# Altium footprint library chipfc_extras_footprint.PCBLIB: 89 footprints (part 4 of 6)
Each footprint in its own frame and in the unit in brackets; x right, y up, seen from the top. Pads: shape width x height; smd on the part's side, far side on the other; paste and mask are expansions set on the pad; w line width, h text height; cw(c..) or ccw(c..) is an arc to the next point about the centre after c.
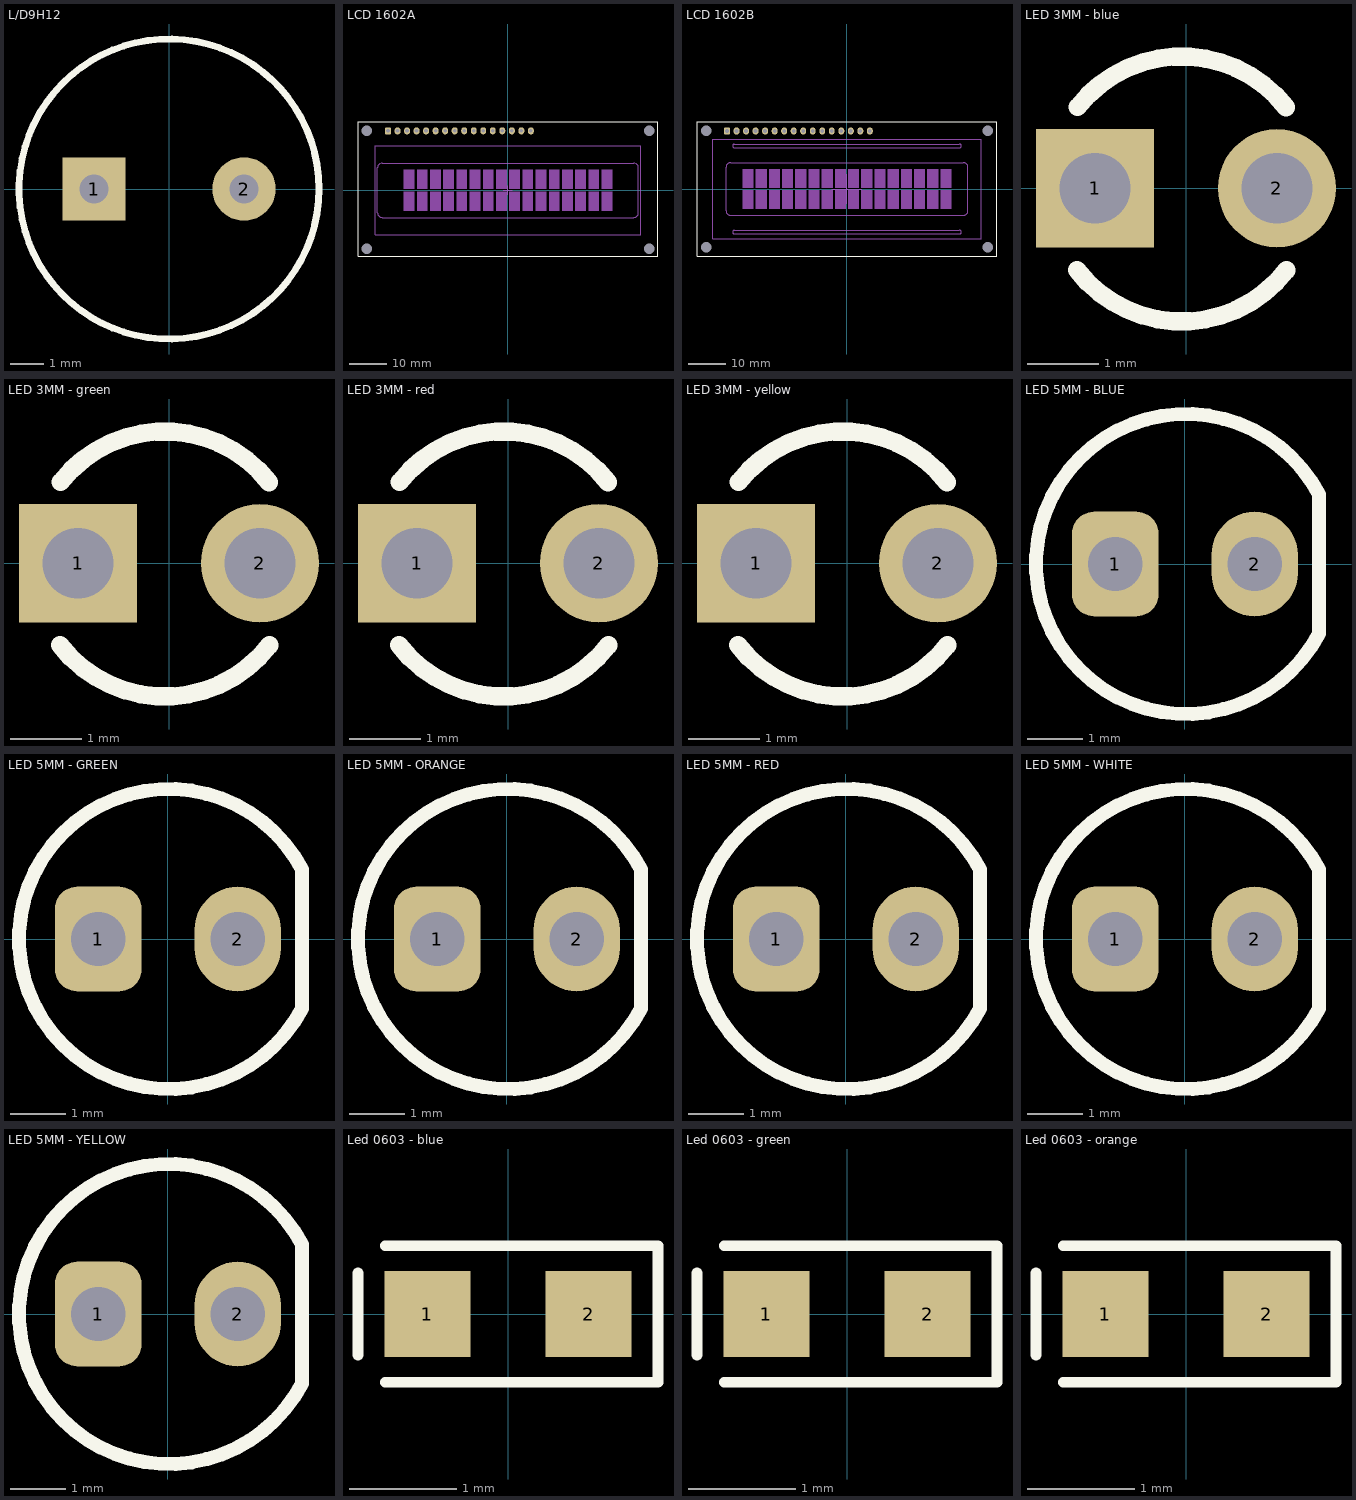
[diagram p3: the footprints below, top view; thin cyan lines are the x and y axes]

## L/D9H12 [mm] "inductor"
pads (2):
  rect 1.905x1.905 hole 0.864: 1(-2.25,0)
  round 1.905 hole 0.864: 2(2.25,0)
Top Overlay:
  circle w0.203: c0,0 r4.5
3D body "User Library-Inductor 10x12 (200 mils).STEP": height 12.13, standoff -3.87, extent -5,-5.115 5,4.885

## LCD 1602A [mm]
pads (20):
  rrect50% 1.575x1.905 hole 0.991: 1(-32,15.85)
  oval 1.575x1.905 hole 0.991: 2(-29.46,15.85) 3(-26.92,15.85) 4(-24.38,15.85) 5(-21.84,15.85) 6(-19.3,15.85) 7(-16.76,15.85) 8(-14.22,15.85) 9(-11.68,15.85) 10(-9.14,15.85) 11(-6.6,15.85) 12(-4.06,15.85) 13(-1.52,15.85) 14(1.02,15.85) 15(3.56,15.85) 16(6.1,15.85)
  round 0 hole 2.8: HOLE(-37.7,15.85) HOLF(37.7,15.85) HOLG(37.7,-15.55) HOLH(-37.7,-15.55)
Top Overlay:
  lines w0.254: -40,-17.65 -40,18.35 40,18.35 40,-17.65 -40,-17.65
Mechanical 13:
  rectangle: 24.95,0.35 27.85,5.5
  rectangle: 24.95,-5.5 27.85,-0.35
  rectangle: 21.43,0.35 24.33,5.5
  rectangle: 21.43,-5.5 24.33,-0.35
  rectangle: 17.91,0.35 20.81,5.5
  rectangle: 17.91,-5.5 20.81,-0.35
  rectangle: 14.39,0.35 17.29,5.5
  rectangle: 14.39,-5.5 17.29,-0.35
  rectangle: 10.87,0.35 13.77,5.5
  rectangle: 10.87,-5.5 13.77,-0.35
  rectangle: 7.35,0.35 10.25,5.5
  rectangle: 7.35,-5.5 10.25,-0.35
  rectangle: 3.83,0.35 6.73,5.5
  rectangle: 3.83,-5.5 6.73,-0.35
  rectangle: 0.31,0.35 3.21,5.5
  rectangle: 0.31,-5.5 3.21,-0.35
  rectangle: -3.21,0.35 -0.31,5.5
  rectangle: -3.21,-5.5 -0.31,-0.35
  rectangle: -6.73,0.35 -3.83,5.5
  rectangle: -6.73,-5.5 -3.83,-0.35
  rectangle: -10.25,0.35 -7.35,5.5
  rectangle: -10.25,-5.5 -7.35,-0.35
  rectangle: -13.77,0.35 -10.87,5.5
  rectangle: -13.77,-5.5 -10.87,-0.35
  rectangle: -17.29,0.35 -14.39,5.5
  rectangle: -17.29,-5.5 -14.39,-0.35
  rectangle: -20.81,0.35 -17.91,5.5
  rectangle: -20.81,-5.5 -17.91,-0.35
  rectangle: -24.33,0.35 -21.43,5.5
  rectangle: -24.33,-5.5 -21.43,-0.35
  rectangle: -27.85,-5.5 -24.95,-0.35
  rectangle: -27.85,0.35 -24.95,5.5
  lines w0.203: -1.2,0 1.2,0 ; 0,-1.2 0,1.2 ; -35.4,-11.9 35.4,-11.9 35.4,11.9 -35.4,11.9 -35.4,-11.9 ; -34.8,-5.95 ccw(c-33.5,-5.95) -33.5,-7.25 33.5,-7.25 ccw(c33.5,-5.95) 34.8,-5.95 34.8,5.95 ccw(c33.5,5.95) 33.5,7.25 -33.5,7.25 ccw(c-33.5,5.95) -34.8,5.95 -34.8,-5.95
3D body "User Library-AC162B.step": height 11, standoff -2.9, extent -40,-17.65 40,18.35

## LCD 1602B [mm]
pads (20):
  rrect50% 1.575x1.905 hole 0.991: 1(-32,15.46)
  oval 1.575x1.905 hole 0.991: 2(-29.46,15.46) 3(-26.92,15.46) 4(-24.38,15.46) 5(-21.84,15.46) 6(-19.3,15.46) 7(-16.76,15.46) 8(-14.22,15.46) 9(-11.68,15.46) 10(-9.14,15.46) 11(-6.6,15.46) 12(-4.06,15.46) 13(-1.52,15.46) 14(1.02,15.46) 15(3.56,15.46) 16(6.1,15.46)
  round 0 hole 2.8: HOLE(-37.55,15.5) HOLF(37.55,15.5) HOLG(37.55,-15.5) HOLH(-37.55,-15.5)
Top Overlay:
  lines w0.254: -40,-18 40,-18 40,18 -40,18 -40,-18
Mechanical 1:
  lines w0.203: -4,0 4,0 ; 0,-4 0,4
Mechanical 13:
  rectangle: -27.9,0.3 -24.9,5.32
  rectangle: -27.9,-5.32 -24.9,-0.3
  rectangle: -24.38,-5.32 -21.38,-0.3
  rectangle: -24.38,0.3 -21.38,5.32
  rectangle: -20.86,-5.32 -17.86,-0.3
  rectangle: -20.86,0.3 -17.86,5.32
  rectangle: -17.34,-5.32 -14.34,-0.3
  rectangle: -17.34,0.3 -14.34,5.32
  rectangle: -13.82,-5.32 -10.82,-0.3
  rectangle: -13.82,0.3 -10.82,5.32
  rectangle: -10.3,-5.32 -7.3,-0.3
  rectangle: -10.3,0.3 -7.3,5.32
  rectangle: -6.78,-5.32 -3.78,-0.3
  rectangle: -6.78,0.3 -3.78,5.32
  rectangle: -3.26,-5.32 -0.26,-0.3
  rectangle: -3.26,0.3 -0.26,5.32
  rectangle: 0.26,-5.32 3.26,-0.3
  rectangle: 0.26,0.3 3.26,5.32
  rectangle: 3.78,-5.32 6.78,-0.3
  rectangle: 3.78,0.3 6.78,5.32
  rectangle: 7.3,-5.32 10.3,-0.3
  rectangle: 7.3,0.3 10.3,5.32
  rectangle: 10.82,-5.32 13.82,-0.3
  rectangle: 10.82,0.3 13.82,5.32
  rectangle: 14.34,-5.32 17.34,-0.3
  rectangle: 14.34,0.3 17.34,5.32
  rectangle: 17.86,-5.32 20.86,-0.3
  rectangle: 17.86,0.3 20.86,5.32
  rectangle: 21.38,-5.32 24.38,-0.3
  rectangle: 21.38,0.3 24.38,5.32
  rectangle: 24.9,-5.32 27.9,-0.3
  rectangle: 24.9,0.3 27.9,5.32
  lines w0.203: -35.75,-13.25 35.75,-13.25 35.75,13.25 -35.75,13.25 -35.75,-13.25 ; -32.25,-5.75 ccw(c-31,-5.75) -31,-7 31,-7 ccw(c31,-5.75) 32.25,-5.75 32.25,5.75 ccw(c31,5.75) 31,7 -31,7 ccw(c-31,5.75) -32.25,5.75 -32.25,-5.75 ; -30,-12 cw(c-30,-11.5) -30,-11 30,-11 cw(c30,-11.5) 30,-12 -30,-12 ; -30,11 cw(c-30,11.5) -30,12 30,12 cw(c30,11.5) 30,11 -30,11
3D body "User Library-AC162B.step": height 11, standoff -2.9, extent -40,-18 40,18

## LED 3MM - blue [mil]
pads (2):
  rect 65x65 hole 39: 1(-50,0)
  round 65 hole 39: 2(50,0)
Top Overlay:
  lines w10: -60.03,-45.02 ccw(c-2.37,-0.43) 55.19,-45.15 ; -59.61,44.69 cw(c-2.37,-0.43) 55,44.52
3D body "User Library-LED_d3-BLU.STEP": height 195.87, standoff -98.43, extent -65.51,-65.07 61.01,64.74

## LED 3MM - green [mil]
pads (2):
  rect 65x65 hole 39: 1(-50,0)
  round 65 hole 39: 2(50,0)
Top Overlay:
  lines w10: -60.03,-45.02 ccw(c-2.37,-0.43) 55.19,-45.15 ; -59.61,44.69 cw(c-2.37,-0.43) 55,44.52
3D body "User Library-LED D3mm GREEN.STEP": height 207.04, standoff -107.93, extent -65.51,-64.9 64.41,64.57

## LED 3MM - red [mil]
pads (2):
  rect 65x65 hole 39: 1(-50,0)
  round 65 hole 39: 2(50,0)
Top Overlay:
  lines w10: -60.03,-45.02 ccw(c-2.37,-0.43) 55.19,-45.15 ; -59.61,44.69 cw(c-2.37,-0.43) 55,44.52
3D body "User Library-LED D3mm RED.STEP": height 207.04, standoff -107.93, extent -65.51,-64.9 64.41,64.57

## LED 3MM - yellow [mil]
pads (2):
  rect 65x65 hole 39: 1(-50,0)
  round 65 hole 39: 2(50,0)
Top Overlay:
  lines w10: -60.03,-45.02 ccw(c-2.37,-0.43) 55.19,-45.15 ; -59.61,44.69 cw(c-2.37,-0.43) 55,44.52
3D body "SW3dPS-LEDd3Y.STEP": height 207.04, standoff -107.93, extent -65.51,-64.9 64.42,64.57

## LED 5MM - BLUE [mil]
pads (2):
  rrect50% 62x75 hole 39: 1(-50,0)
  oval 62x75 hole 39: 2(50,0)
Top Overlay:
  lines w10: 96.08,-49.99 cw(c0.76,0.01) 96.08,50.01 96.08,-49.99
3D body "User Library-LED 5mm Blue.STEP": height 339.75, standoff -242.93, extent -117.31,-118.49 96.08,118.5

## LED 5MM - GREEN [mil]
pads (2):
  rrect50% 62x75 hole 39: 1(-50,0)
  oval 62x75 hole 39: 2(50,0)
Top Overlay:
  lines w10: 96.08,-49.99 cw(c0.76,0.01) 96.08,50.01 96.08,-49.99
3D body "User Library-LED 5mm Green.STEP": height 339.75, standoff -242.93, extent -117.31,-118.49 96.08,118.5

## LED 5MM - ORANGE [mil]
pads (2):
  rrect50% 62x75 hole 39: 1(-50,0)
  oval 62x75 hole 39: 2(50,0)
Top Overlay:
  lines w10: 96.08,-49.99 cw(c0.76,0.01) 96.08,50.01 96.08,-49.99
3D body "User Library-LED 5mm Orange.STEP": height 339.75, standoff -242.93, extent -117.31,-118.49 96.08,118.5

## LED 5MM - RED [mil]
pads (2):
  rrect50% 62x75 hole 39: 1(-50,0)
  oval 62x75 hole 39: 2(50,0)
Top Overlay:
  lines w10: 96.08,-49.99 cw(c0.76,0.01) 96.08,50.01 96.08,-49.99
3D body "User Library-LED 5mm Red.STEP": height 339.75, standoff -242.93, extent -117.31,-118.49 96.08,118.5

## LED 5MM - WHITE [mil]
pads (2):
  rrect50% 62x75 hole 39: 1(-50,0)
  oval 62x75 hole 39: 2(50,0)
Top Overlay:
  lines w10: 96.08,-49.99 cw(c0.76,0.01) 96.08,50.01 96.08,-49.99
3D body "User Library-LED 5mm White.step": height 335.65, standoff -117.11, extent -118.12,-118.02 98.42,118.04

## LED 5MM - YELLOW [mil]
pads (2):
  rrect50% 62x75 hole 39: 1(-50,0)
  oval 62x75 hole 39: 2(50,0)
Top Overlay:
  lines w10: 96.08,-49.99 cw(c0.76,0.01) 96.08,50.01 96.08,-49.99
3D body "User Library-LED 5mm Yellow.STEP": height 339.75, standoff -242.93, extent -117.31,-118.49 96.08,118.5

## Led 0603 - blue [mm] "Led SMD 0603"
height 0.8
pads (2):
  rect 0.8x0.8 smd: 1(-0.75,0) 2(0.75,0)
Top Overlay:
  lines w0.1: -1.397,-0.381 -1.397,0.381 ; -1.143,-0.635 1.397,-0.635 1.397,0.635 -1.143,0.635
3D body "User Library-led_0603.step": height 0.6, standoff 0, extent -0.81,-0.4 0.81,0.4

## Led 0603 - green [mm] "Led SMD 0603"
height 0.8
pads (2):
  rect 0.8x0.8 smd: 1(-0.75,0) 2(0.75,0)
Top Overlay:
  lines w0.1: -1.397,-0.381 -1.397,0.381 ; -1.143,-0.635 1.397,-0.635 1.397,0.635 -1.143,0.635
3D body "User Library-led_0603-green.step": height 0.6, standoff 0, extent -0.81,-0.4 0.81,0.4

## Led 0603 - orange [mm] "Led SMD 0603"
height 0.8
pads (2):
  rect 0.8x0.8 smd: 1(-0.75,0) 2(0.75,0)
Top Overlay:
  lines w0.1: -1.397,-0.381 -1.397,0.381 ; -1.143,-0.635 1.397,-0.635 1.397,0.635 -1.143,0.635
3D body "User Library-led_0603-orange.step": height 0.6, standoff 0, extent -0.81,-0.4 0.81,0.4